# Altium footprint library 3M THD.PcbLib: 163 footprints (part 3 of 14) (continued)
## 3M_10268-6212PC [mm] "68 contacts, Mini D Ribbon (MDR), .050\" Boardmount Through-hole Vertical Receptacle - Shielded"
height 11
pads (70):
  round 1.4 hole 0.8: 1(20.955,2.858) 2(19.685,0.953) 3(18.415,2.858) 4(17.145,0.953) 5(15.875,2.858) 6(14.605,0.953) 7(13.335,2.858) 8(12.065,0.953) 9(10.795,2.858) 10(9.525,0.953) 11(8.255,2.858) 12(6.985,0.953) 13(5.715,2.858) 14(4.445,0.953) 15(3.175,2.858) 16(1.905,0.953) 17(0.635,2.858) 18(-0.635,0.953) 19(-1.905,2.858) 20(-3.175,0.953) 21(-4.445,2.858) 22(-5.715,0.953) 23(-6.985,2.858) 24(-8.255,0.953) 25(-9.525,2.858) 26(-10.795,0.953) 27(-12.065,2.858) 28(-13.335,0.953) 29(-14.605,2.858) 30(-15.875,0.953) 31(-17.145,2.858) 32(-18.415,0.953) 33(-19.685,2.858) 34(-20.955,0.953) 35(20.955,-0.952) 36(19.685,-2.857) 37(18.415,-0.952) 38(17.145,-2.857) 39(15.875,-0.952) 40(14.605,-2.857) 41(13.335,-0.952) 42(12.065,-2.857) 43(10.795,-0.952) 44(9.525,-2.857) 45(8.255,-0.952) 46(6.985,-2.857) 47(5.715,-0.952) 48(4.445,-2.857) 49(3.175,-0.952) 50(1.905,-2.857) 51(0.635,-0.952) 52(-0.635,-2.857) 53(-1.905,-0.952) 54(-3.175,-2.857) 55(-4.445,-0.952) 56(-5.715,-2.857) 57(-6.985,-0.952) 58(-8.255,-2.857) 59(-9.525,-0.952) 60(-10.795,-2.857) 61(-12.065,-0.952) 62(-13.335,-2.857) 63(-14.605,-0.952) 64(-15.875,-2.857) 65(-17.145,-0.952) 66(-18.415,-2.857) 67(-19.685,-0.952) 68(-20.955,-2.857)
  round 5.5 hole 2.8: 69(-28.956,0) 70(28.956,0)
Top Overlay:
  circle w0.3: c20.955,5.207 r0.15
  lines w0.2: -31.877,-0.684 -31.877,-4.318 -30.607,-4.318 -30.607,-4.572 30.607,-4.572 30.607,-4.318 31.877,-4.318 31.877,-0.684 ; -31.877,0.684 -31.877,4.318 -30.607,4.318 -30.607,4.572 30.607,4.572 30.607,4.318 31.877,4.318 31.877,0.684 ; -31.623,-4.318 -31.623,-1.374 ; -31.623,1.374 -31.623,4.318 ; -26.924,-2.207 -26.924,-3.556 -24.384,-3.556 -24.384,3.556 -26.924,3.556 -26.924,2.207 ; -26.41,-1.587 -25.654,-1.587 -25.654,1.588 -26.41,1.588 ; -26.289,-3.556 -26.289,-1.587 ; -26.289,1.588 -26.289,3.556 ; -23.483,1.734 cw(c-22.225,1.905) -22.551,3.132 ; -23.02,-0.035 -22.515,-1.919 ; 22.971,2.933 cw(c22.225,1.905) 23.452,1.576 23.038,0.032 ; 26.289,-3.556 26.289,-1.587 ; 26.289,1.588 26.289,3.556 ; 26.41,-1.587 25.654,-1.587 25.654,1.588 26.41,1.588 ; 26.924,-2.207 26.924,-3.556 24.384,-3.556 24.384,3.556 26.924,3.556 26.924,2.207 ; 31.623,-4.318 31.623,-1.374 ; 31.623,1.374 31.623,4.318
  text "68" at -23.67,-3.357 h1.02
  text "67" at -22.4,-1.452 h1.02
  text "33" at -22.4,2.358 h1.02
  text "34" at -23.693,0.453 h1.02
  text "36" at 20.804,-3.357 h1.02
  text "35" at 22.051,-1.452 h1.02
  text "2" at 20.622,0.453 h1.02
  text "1" at 22.106,2.358 h1.02
Mechanical 8:
  lines w0.1: -29.956,0 -28.956,0 -28.956,1 ; -21.955,-2.857 -20.955,-2.857 -20.955,-1.857 ; -21.955,0.953 -20.955,0.953 -20.955,1.953 ; -20.685,-0.952 -19.685,-0.952 -19.685,0.048 ; -20.685,2.858 -19.685,2.858 -19.685,3.858 ; -19.415,-2.857 -18.415,-2.857 -18.415,-1.857 ; -19.415,0.953 -18.415,0.953 -18.415,1.953 ; -18.145,-0.952 -17.145,-0.952 -17.145,0.048 ; -18.145,2.858 -17.145,2.858 -17.145,3.858 ; -16.875,-2.857 -15.875,-2.857 -15.875,-1.857 ; -16.875,0.953 -15.875,0.953 -15.875,1.953 ; -15.605,-0.952 -14.605,-0.952 -14.605,0.048 ; -15.605,2.858 -14.605,2.858 -14.605,3.858 ; -14.335,-2.857 -13.335,-2.857 -13.335,-1.857 ; -14.335,0.953 -13.335,0.953 -13.335,1.953 ; -13.065,-0.952 -12.065,-0.952 -12.065,0.048 ; -13.065,2.858 -12.065,2.858 -12.065,3.858 ; -11.795,-2.857 -10.795,-2.857 -10.795,-1.857 ; -11.795,0.953 -10.795,0.953 -10.795,1.953 ; -10.525,-0.952 -9.525,-0.952 -9.525,0.048 ; -10.525,2.858 -9.525,2.858 -9.525,3.858 ; -9.255,-2.857 -8.255,-2.857 -8.255,-1.857 ; -9.255,0.953 -8.255,0.953 -8.255,1.953 ; -7.985,-0.952 -6.985,-0.952 -6.985,0.048 ; -7.985,2.858 -6.985,2.858 -6.985,3.858 ; -6.715,-2.857 -5.715,-2.857 -5.715,-1.857 ; -6.715,0.953 -5.715,0.953 -5.715,1.953 ; -5.445,-0.952 -4.445,-0.952 -4.445,0.048 ; -5.445,2.858 -4.445,2.858 -4.445,3.858 ; -4.175,-2.857 -3.175,-2.857 -3.175,-1.857 ; -4.175,0.953 -3.175,0.953 -3.175,1.953 ; -2.905,-0.952 -1.905,-0.952 -1.905,0.048 ; -2.905,2.858 -1.905,2.858 -1.905,3.858 ; -1.635,-2.857 -0.635,-2.857 -0.635,-1.857 ; -1.635,0.953 -0.635,0.953 -0.635,1.953 ; -1,0 0,0 0,-1 ; -0.365,-0.952 0.635,-0.952 0.635,0.048 ; -0.365,2.858 0.635,2.858 0.635,3.858 ; 0.905,-2.857 1.905,-2.857 1.905,-1.857 ; 0.905,0.953 1.905,0.953 1.905,1.953 ; 2.175,-0.952 3.175,-0.952 3.175,0.048 ; 2.175,2.858 3.175,2.858 3.175,3.858 ; 3.445,-2.857 4.445,-2.857 4.445,-1.857 ; 3.445,0.953 4.445,0.953 4.445,1.953 ; 4.715,-0.952 5.715,-0.952 5.715,0.048 ; 4.715,2.858 5.715,2.858 5.715,3.858 ; 5.985,-2.857 6.985,-2.857 6.985,-1.857 ; 5.985,0.953 6.985,0.953 6.985,1.953 ; 7.255,-0.952 8.255,-0.952 8.255,0.048 ; 7.255,2.858 8.255,2.858 8.255,3.858 ; 8.525,-2.857 9.525,-2.857 9.525,-1.857 ; 8.525,0.953 9.525,0.953 9.525,1.953 ; 9.795,-0.952 10.795,-0.952 10.795,0.048 ; 9.795,2.858 10.795,2.858 10.795,3.858 ; 11.065,-2.857 12.065,-2.857 12.065,-1.857 ; 11.065,0.953 12.065,0.953 12.065,1.953 ; 12.335,-0.952 13.335,-0.952 13.335,0.048 ; 12.335,2.858 13.335,2.858 13.335,3.858 ; 13.605,-2.857 14.605,-2.857 14.605,-1.857 ; 13.605,0.953 14.605,0.953 14.605,1.953 ; 14.875,-0.952 15.875,-0.952 15.875,0.048 ; 14.875,2.858 15.875,2.858 15.875,3.858 ; 16.145,-2.857 17.145,-2.857 17.145,-1.857 ; 16.145,0.953 17.145,0.953 17.145,1.953 ; 17.415,-0.952 18.415,-0.952 18.415,0.048 ; 17.415,2.858 18.415,2.858 18.415,3.858 ; 18.685,-2.857 19.685,-2.857 19.685,-1.857 ; 18.685,0.953 19.685,0.953 19.685,1.953 ; 19.955,-0.952 20.955,-0.952 20.955,0.048 ; 19.955,2.858 20.955,2.858 20.955,3.858 ; 27.956,0 28.956,0 28.956,1 ; -32.956,-5 -32.956,5 -23.956,5 -23.956,-5 -32.956,-5 ; 23.956,-5 23.956,5 32.956,5 32.956,-5 23.956,-5
Mechanical 14:
  drawing of 252 lines, arcs and shapes, not listed
3D body "3M-10268-6212PC.stp": height 11.18, standoff -3.4, extent -31.877,-4.572 31.877,4.572

## 3M_12226-1150-00FR [mm] "26 contacts, 0.8mm Pitch, Through-hole Vertical Shrunk Delta Ribbon (SDR) Receptacle, 112 Series"
height 11.8
pads (30):
  round 1.15 hole 0.65: 1(4.8,2.13) 2(4,0.98) 3(3.2,2.13) 4(2.4,0.98) 5(1.6,2.13) 6(0.8,0.98) 7(0,2.13) 8(-0.8,0.98) 9(-1.6,2.13) 10(-2.4,0.98) 11(-3.2,2.13) 12(-4,0.98) 13(-4.8,2.13) 14(4.8,-0.98) 15(4,-2.13) 16(3.2,-0.98) 17(2.4,-2.13) 18(1.6,-0.98) 19(0.8,-2.13) 20(0,-0.98) 21(-0.8,-2.13) 22(-1.6,-0.98) 23(-2.4,-2.13) 24(-3.2,-0.98) 25(-4,-2.13) 26(-4.8,-0.98)
  round 1.9 hole 1.2: 27(-6.925,0) 28(6.925,0)
  round 1 hole 1.75 mask+0.375: MECH1(-6.15,-2.975) MECH2(6.15,-2.975)
Top Overlay:
  lines w0.2: -8.094,-0.675 cw(c-9.6,0) -8.094,0.675 ; -7.928,-0.903 cw(c-9.6,0) -7.928,0.903 ; -7.333,-2.5 -12.4,-2.5 -12.4,2.5 -5.756,2.5 ; -6.624,1.316 cw(c-5.8,0.75) -5.8,1.75 -5.752,1.75 ; -6.525,2.5 -6.525,3.75 -5.775,3.75 -5.775,2.5 ; -6.327,1.21 cw(c-5.8,0.75) -5.8,1.45 -5.567,1.45 ; -6.294,-1.194 ccw(c-5.398,-0.75) -5.48,-1.747 ; -6.043,-1.022 ccw(c-5.398,-0.75) -5.755,-1.352 ; 5.481,-1.747 ccw(c5.398,-0.75) 6.294,-1.194 ; 5.567,1.45 5.775,1.45 cw(c5.791,0.731) 6.327,1.21 ; 5.752,1.75 5.8,1.75 cw(c5.8,0.75) 6.624,1.316 ; 5.755,-1.352 ccw(c5.398,-0.75) 6.043,-1.022 ; 5.756,2.5 12.4,2.5 12.4,-2.5 7.333,-2.5 ; 5.775,2.5 5.775,3.75 6.525,3.75 6.525,2.5 ; 7.929,-0.903 ccw(c9.6,0) 7.929,0.903 ; 8.094,-0.675 ccw(c9.6,0) 8.094,0.675 ; 4.3,3.75 5.3,3.75 4.8,3.25 4.3,3.75
Mechanical 8:
  circle w0.1: c6.15,-2.975 r0.875
  circle w0.1: c-6.15,-2.975 r0.875
  circle w0.1: c-6.925,0 r0.6
  circle w0.1: c6.925,0 r0.6
  circle w0.1: c6.925,0 r0.95
  circle w0.1: c-6.925,0 r0.95
  circle w0.1: c4.8,2.13 r0.325
  lines w0.1: -7.425,0 -6.925,0 ; -6.925,-0.5 -6.925,0 ; -6.925,0.5 -6.925,0 ; -6.65,-2.975 -6.15,-2.975 ; -6.425,0 -6.925,0 ; -6.15,-3.475 -6.15,-2.975 ; -6.15,-2.475 -6.15,-2.975 ; -5.65,-2.975 -6.15,-2.975 ; -5.3,-0.98 -4.8,-0.98 ; -5.3,2.13 -4.8,2.13 ; -4.8,-1.48 -4.8,-0.98 ; -4.8,-0.48 -4.8,-0.98 ; -4.8,1.63 -4.8,2.13 ; -4.8,2.63 -4.8,2.13 ; -4.5,-2.13 -4,-2.13 ; -4.5,0.98 -4,0.98 ; -4.3,-0.98 -4.8,-0.98 ; -4.3,2.13 -4.8,2.13 ; -4,-2.63 -4,-2.13 ; -4,-1.63 -4,-2.13 ; -4,0.48 -4,0.98 ; -4,1.48 -4,0.98 ; -3.7,-0.98 -3.2,-0.98 ; -3.7,2.13 -3.2,2.13 ; -3.5,-2.13 -4,-2.13 ; -3.5,0.98 -4,0.98 ; -3.2,-1.48 -3.2,-0.98 ; -3.2,-0.48 -3.2,-0.98 ; -3.2,1.63 -3.2,2.13 ; -3.2,2.63 -3.2,2.13 ; -2.9,-2.13 -2.4,-2.13 ; -2.9,0.98 -2.4,0.98 ; -2.7,-0.98 -3.2,-0.98 ; -2.7,2.13 -3.2,2.13 ; -2.4,-2.63 -2.4,-2.13 ; -2.4,-1.63 -2.4,-2.13 ; -2.4,0.48 -2.4,0.98 ; -2.4,1.48 -2.4,0.98 ; -2.1,-0.98 -1.6,-0.98 ; -2.1,2.13 -1.6,2.13 ; -1.9,-2.13 -2.4,-2.13 ; -1.9,0.98 -2.4,0.98 ; -1.6,-1.48 -1.6,-0.98 ; -1.6,-0.48 -1.6,-0.98 ; -1.6,1.63 -1.6,2.13 ; -1.6,2.63 -1.6,2.13 ; -1.3,-2.13 -0.8,-2.13 ; -1.3,0.98 -0.8,0.98 ; -1.1,-0.98 -1.6,-0.98 ; -1.1,2.13 -1.6,2.13 ; -0.8,-2.63 -0.8,-2.13 ; -0.8,-1.63 -0.8,-2.13 ; -0.8,0.48 -0.8,0.98 ; -0.8,1.48 -0.8,0.98 ; -0.5,-0.98 0,-0.98 ; -0.5,2.13 0,2.13 ; -0.354,-0.354 0,0 ; -0.354,0.354 0,0 ; -0.3,-2.13 -0.8,-2.13 ; -0.3,0.98 -0.8,0.98 ; 0,-1.48 0,-0.98 ; 0,-0.48 0,-0.98 ; 0,1.63 0,2.13 ; 0,2.63 0,2.13 ; 0.3,-2.13 0.8,-2.13 ; 0.3,0.98 0.8,0.98 ; 0.354,-0.354 0,0 ; 0.354,0.354 0,0 ; 0.5,-0.98 0,-0.98 ; 0.5,2.13 0,2.13 ; 0.8,-2.63 0.8,-2.13 ; 0.8,-1.63 0.8,-2.13 ; 0.8,0.48 0.8,0.98 ; 0.8,1.48 0.8,0.98 ; 1.1,-0.98 1.6,-0.98 ; 1.1,2.13 1.6,2.13 ; 1.3,-2.13 0.8,-2.13 ; 1.3,0.98 0.8,0.98 ; 1.6,-1.48 1.6,-0.98 ; 1.6,-0.48 1.6,-0.98 ; 1.6,1.63 1.6,2.13 ; 1.6,2.63 1.6,2.13 ; 1.9,-2.13 2.4,-2.13 ; 1.9,0.98 2.4,0.98 ; 2.1,-0.98 1.6,-0.98 ; 2.1,2.13 1.6,2.13 ; 2.4,-2.63 2.4,-2.13 ; 2.4,-1.63 2.4,-2.13 ; 2.4,0.48 2.4,0.98 ; 2.4,1.48 2.4,0.98 ; 2.7,-0.98 3.2,-0.98 ; 2.7,2.13 3.2,2.13 ; 2.9,-2.13 2.4,-2.13 ; 2.9,0.98 2.4,0.98 ; 3.2,-1.48 3.2,-0.98 ; 3.2,-0.48 3.2,-0.98 ; 3.2,1.63 3.2,2.13 ; 3.2,2.63 3.2,2.13 ; 3.5,-2.13 4,-2.13 ; 3.5,0.98 4,0.98 ; 3.7,-0.98 3.2,-0.98 ; 3.7,2.13 3.2,2.13 ; 4,-2.63 4,-2.13 ; 4,-1.63 4,-2.13 ; 4,0.48 4,0.98 ; 4,1.48 4,0.98 ; 4.3,-0.98 4.8,-0.98 ; 4.3,2.13 4.8,2.13 ; 4.5,-2.13 4,-2.13 ; 4.5,0.98 4,0.98 ; 4.8,-1.48 4.8,-0.98 ; 4.8,-0.48 4.8,-0.98 ; 4.8,1.63 4.8,2.13 ; 4.8,2.63 4.8,2.13 ; 5.3,-0.98 4.8,-0.98 ; 5.3,2.13 4.8,2.13 ; 5.65,-2.975 6.15,-2.975 ; 6.15,-3.475 6.15,-2.975 ; 6.15,-2.475 6.15,-2.975 ; 6.425,0 6.925,0 ; 6.65,-2.975 6.15,-2.975 ; 6.925,-0.5 6.925,0 ; 6.925,0.5 6.925,0 ; 7.425,0 6.925,0
Mechanical 14:
  circle w0.1: c-9.6,0 r1.9
  circle w0.1: c9.6,0 r1.9
  circle w0.1: c9.6,0 r1.65
  circle w0.1: c-9.6,0 r1.65
  lines w0.1: -6.525,2.5 -6.525,3.75 -5.775,3.75 -5.775,2.5 ; -4.95,-0.6 -4.95,-0.2 -4.65,-0.2 -4.65,-0.6 ; -4.95,0.6 -4.95,0.2 -4.65,0.2 -4.65,0.6 ; -4.15,-0.6 -4.15,-0.2 -3.85,-0.2 -3.85,-0.6 ; -4.15,0.6 -4.15,0.2 -3.85,0.2 -3.85,0.6 ; -3.35,-0.6 -3.35,-0.2 -3.05,-0.2 -3.05,-0.6 ; -3.35,0.6 -3.35,0.2 -3.05,0.2 -3.05,0.6 ; -2.55,-0.6 -2.55,-0.2 -2.25,-0.2 -2.25,-0.6 ; -2.55,0.6 -2.55,0.2 -2.25,0.2 -2.25,0.6 ; -1.75,-0.6 -1.75,-0.2 -1.45,-0.2 -1.45,-0.6 ; -1.75,0.6 -1.75,0.2 -1.45,0.2 -1.45,0.6 ; -0.95,-0.6 -0.95,-0.2 -0.65,-0.2 -0.65,-0.6 ; -0.95,0.6 -0.95,0.2 -0.65,0.2 -0.65,0.6 ; -0.15,-0.6 -0.15,-0.2 0.15,-0.2 0.15,-0.6 ; -0.15,0.6 -0.15,0.2 0.15,0.2 0.15,0.6 ; 0.65,-0.6 0.65,-0.2 0.95,-0.2 0.95,-0.6 ; 0.65,0.6 0.65,0.2 0.95,0.2 0.95,0.6 ; 1.45,-0.6 1.45,-0.2 1.75,-0.2 1.75,-0.6 ; 1.45,0.6 1.45,0.2 1.75,0.2 1.75,0.6 ; 2.25,-0.6 2.25,-0.2 2.55,-0.2 2.55,-0.6 ; 2.25,0.6 2.25,0.2 2.55,0.2 2.55,0.6 ; 3.05,-0.6 3.05,-0.2 3.35,-0.2 3.35,-0.6 ; 3.05,0.6 3.05,0.2 3.35,0.2 3.35,0.6 ; 3.85,-0.6 3.85,-0.2 4.15,-0.2 4.15,-0.6 ; 3.85,0.6 3.85,0.2 4.15,0.2 4.15,0.6 ; 4.65,-0.6 4.65,-0.2 4.95,-0.2 4.95,-0.6 ; 4.65,0.6 4.65,0.2 4.95,0.2 4.95,0.6 ; 5.775,1.45 -5.8,1.45 ccw(c-5.8,0.75) -6.476,0.569 -6.074,-0.931 ccw(c-5.398,-0.75) -5.398,-1.45 5.398,-1.45 ccw(c5.398,-0.75) 6.074,-0.931 6.49,0.565 ccw(c5.791,0.731) 5.8,1.45 ; 5.775,2.5 5.775,3.75 6.525,3.75 6.525,2.5 ; -12.4,-2.5 12.4,-2.5 12.4,2.5 -12.4,2.5 -12.4,-2.5 ; -6.766,0.491 cw(c-5.8,0.75) -5.8,1.75 5.8,1.75 cw(c5.8,0.75) 6.766,0.491 6.364,-1.009 cw(c5.398,-0.75) 5.398,-1.75 -5.398,-1.75 cw(c-5.398,-0.75) -6.364,-1.009 -6.766,0.491 ; -5.6,-0.6 5.6,-0.6 5.6,0.6 -5.6,0.6 -5.6,-0.6 ; 4.3,3.75 4.8,3.25 5.3,3.75 4.3,3.75
3D body "3M_12226-1150-00FR.stp": height 11.5, standoff -2.32, extent -12.4,-3.75 12.4,3.75

## 3M_12226-5150-00FR [mm] "26 contacts, 0.8mm Pitch, Through-hole Right Angle Shrunk Delta Ribbon (SDR) Receptacle, 122 Series"
height 5.3
pads (28):
  round 1.1 hole 0.65: 1(-4.6,-1.9) 2(-3.8,-0.75) 3(-3,-1.9) 4(-2.2,-0.75) 5(-1.4,-1.9) 6(-0.6,-0.75) 7(0.2,-1.9) 8(1,-0.75) 9(1.8,-1.9) 10(2.6,-0.75) 11(3.4,-1.9) 12(4.2,-0.75) 13(5,-1.9) 14(-5,0.45) 15(-4.2,1.6) 16(-3.4,0.45) 17(-2.6,1.6) 18(-1.8,0.45) 19(-1,1.6) 20(-0.2,0.45) 21(0.6,1.6) 22(1.4,0.45) 23(2.2,1.6) 24(3,0.45) 25(3.8,1.6) 26(4.6,0.45)
  round 3 hole 2.3: 27(-9.6,0) 28(9.6,0)
Top Overlay:
  lines w0.2: -12.4,3.05 12.4,3.05 ; -11.5,6.6 -11.5,9.744 -7.7,9.744 -7.7,6.6 ; -11.1,9.744 -11.1,11.244 ; -10.449,-1.7 -12.4,-1.7 -12.4,6.6 12.4,6.6 12.4,-1.7 10.449,-1.7 ; -8.751,-1.7 -8.4,-1.7 -8.4,-2.95 8.4,-2.95 8.4,-1.7 8.751,-1.7 ; -8.1,9.744 -8.1,11.244 ; -6.766,6.6 -6.766,12.3 cw(c-6.466,12.3) -6.466,12.6 6.466,12.6 cw(c6.466,12.3) 6.766,12.3 6.766,6.6 ; -5.8,-2.95 -5.8,-0.107 ; -5.8,1.007 -5.8,3.05 ; 5.8,-2.95 5.8,-2.457 ; 5.8,-1.343 5.8,3.05 ; 7.7,6.6 7.7,9.744 11.5,9.744 11.5,6.6 ; 8.1,9.744 8.1,11.244 ; 11.1,9.744 11.1,11.244 ; -11.5,11.47 -7.7,11.47 ; -11.5,11.47 -11.5,11.244 -7.7,11.244 -7.7,11.47 ; -11.5,11.47 -11.25,12.4 -7.95,12.4 -7.7,11.47 ; 7.7,11.47 11.5,11.47 ; 7.7,11.47 7.95,12.4 11.25,12.4 11.5,11.47 ; 7.7,11.47 7.7,11.244 11.5,11.244 11.5,11.47 ; -5.1,-3.52 -4.1,-3.52 -4.6,-3.02 -5.1,-3.52
Mechanical 8:
  circle w0.1: c-4.2,1.6 r0.328
  circle w0.1: c-4.2,1.6 r0.575
  circle w0.1: c9.6,0 r1.5
  circle w0.1: c9.6,0 r1.15
  circle w0.1: c-9.6,0 r1.5
  circle w0.1: c-9.6,0 r1.15
  lines w0.1: -12.4,6.1 0,6.1 12.4,6.1 ; -10.1,0 -9.6,0 ; -9.6,-0.5 -9.6,0 ; -9.6,0.5 -9.6,0 ; -9.1,0 -9.6,0 ; -5.5,0.45 -5,0.45 ; -5.1,-1.9 -4.6,-1.9 ; -5,-0.05 -5,0.45 ; -5,0.95 -5,0.45 ; -4.7,1.6 -4.2,1.6 ; -4.6,-2.4 -4.6,-1.9 ; -4.6,-1.4 -4.6,-1.9 ; -4.5,0.45 -5,0.45 ; -4.3,-0.75 -3.8,-0.75 ; -4.2,1.1 -4.2,1.6 ; -4.2,2.1 -4.2,1.6 ; -4.1,-1.9 -4.6,-1.9 ; -3.9,0.45 -3.4,0.45 ; -3.8,-1.25 -3.8,-0.75 ; -3.8,-0.25 -3.8,-0.75 ; -3.7,1.6 -4.2,1.6 ; -3.5,-1.9 -3,-1.9 ; -3.4,-0.05 -3.4,0.45 ; -3.4,0.95 -3.4,0.45 ; -3.3,-0.75 -3.8,-0.75 ; -3.1,1.6 -2.6,1.6 ; -3,-2.4 -3,-1.9 ; -3,-1.4 -3,-1.9 ; -2.9,0.45 -3.4,0.45 ; -2.7,-0.75 -2.2,-0.75 ; -2.6,1.1 -2.6,1.6 ; -2.6,2.1 -2.6,1.6 ; -2.5,-1.9 -3,-1.9 ; -2.3,0.45 -1.8,0.45 ; -2.2,-1.25 -2.2,-0.75 ; -2.2,-0.25 -2.2,-0.75 ; -2.1,1.6 -2.6,1.6 ; -1.9,-1.9 -1.4,-1.9 ; -1.8,-0.05 -1.8,0.45 ; -1.8,0.95 -1.8,0.45 ; -1.7,-0.75 -2.2,-0.75 ; -1.5,1.6 -1,1.6 ; -1.4,-2.4 -1.4,-1.9 ; -1.4,-1.4 -1.4,-1.9 ; -1.3,0.45 -1.8,0.45 ; -1.1,-0.75 -0.6,-0.75 ; -1,1.1 -1,1.6 ; -1,2.1 -1,1.6 ; -0.9,-1.9 -1.4,-1.9 ; -0.7,0.45 -0.2,0.45 ; -0.6,-1.25 -0.6,-0.75 ; -0.6,-0.25 -0.6,-0.75 ; -0.5,1.6 -1,1.6 ; -0.354,-0.354 0,0 ; -0.354,0.354 0,0 ; -0.3,-1.9 0.2,-1.9 ; -0.2,0.95 -0.2,0.45 ; -0.1,-0.75 -0.6,-0.75 ; 0.1,1.6 0.6,1.6 ; 0.2,-2.4 0.2,-1.9 ; 0.2,-1.4 0.2,-1.9 ; 0.3,0.45 -0.2,0.45 ; 0.354,-0.354 0,0 ; 0.354,0.354 0,0 ; 0.5,-0.75 1,-0.75 ; 0.6,1.1 0.6,1.6 ; 0.6,2.1 0.6,1.6 ; 0.7,-1.9 0.2,-1.9 ; 0.9,0.45 1.4,0.45 ; 1,-1.25 1,-0.75 ; 1,-0.25 1,-0.75 ; 1.1,1.6 0.6,1.6 ; 1.3,-1.9 1.8,-1.9 ; 1.4,-0.05 1.4,0.45 ; 1.4,0.95 1.4,0.45 ; 1.5,-0.75 1,-0.75 ; 1.7,1.6 2.2,1.6 ; 1.8,-2.4 1.8,-1.9 ; 1.8,-1.4 1.8,-1.9 ; 1.9,0.45 1.4,0.45 ; 2.1,-0.75 2.6,-0.75 ; 2.2,1.1 2.2,1.6 ; 2.2,2.1 2.2,1.6 ; 2.3,-1.9 1.8,-1.9 ; 2.5,0.45 3,0.45 ; 2.6,-1.25 2.6,-0.75 ; 2.6,-0.25 2.6,-0.75 ; 2.7,1.6 2.2,1.6 ; 2.9,-1.9 3.4,-1.9 ; 3,-0.05 3,0.45 ; 3,0.95 3,0.45 ; 3.1,-0.75 2.6,-0.75 ; 3.3,1.6 3.8,1.6 ; 3.4,-2.4 3.4,-1.9 ; 3.4,-1.4 3.4,-1.9 ; 3.5,0.45 3,0.45 ; 3.7,-0.75 4.2,-0.75 ; 3.8,1.1 3.8,1.6 ; 3.8,2.1 3.8,1.6 ; 3.9,-1.9 3.4,-1.9 ; 4.1,0.45 4.6,0.45 ; 4.2,-1.25 4.2,-0.75 ; 4.2,-0.25 4.2,-0.75 ; 4.3,1.6 3.8,1.6 ; 4.5,-1.9 5,-1.9 ; 4.6,-0.05 4.6,0.45 ; 4.6,0.95 4.6,0.45 ; 4.7,-0.75 4.2,-0.75 ; 5,-2.4 5,-1.9 ; 5,-1.4 5,-1.9 ; 5.1,0.45 4.6,0.45 ; 5.5,-1.9 5,-1.9 ; 9.1,0 9.6,0 ; 9.6,-0.5 9.6,0 ; 9.6,0.5 9.6,0 ; 10.1,0 9.6,0
Mechanical 14:
  lines w0.1: -12.4,3.05 12.4,3.05 ; -11.5,6.6 -11.5,9.744 -7.7,9.744 -7.7,6.6 ; -11.1,9.744 -11.1,11.244 ; -8.1,9.744 -8.1,11.244 ; -6.766,6.6 -6.766,12.3 cw(c-6.466,12.3) -6.466,12.6 6.466,12.6 cw(c6.466,12.3) 6.766,12.3 6.766,6.6 ; -5.8,-2.95 -5.8,3.05 ; 5.8,-2.95 5.8,3.05 ; 7.7,6.6 7.7,9.744 11.5,9.744 11.5,6.6 ; 8.1,9.744 8.1,11.244 ; 11.1,9.744 11.1,11.244 ; -11.5,11.47 -7.7,11.47 ; -11.5,11.47 -11.5,11.244 -7.7,11.244 -7.7,11.47 ; -11.5,11.47 -11.25,12.4 -7.95,12.4 -7.7,11.47 ; 7.7,11.47 11.5,11.47 ; 7.7,11.47 7.95,12.4 11.25,12.4 11.5,11.47 ; 7.7,11.47 7.7,11.244 11.5,11.244 11.5,11.47 ; -12.4,-1.7 -12.4,6.6 12.4,6.6 12.4,-1.7 8.4,-1.7 8.4,-2.95 -8.4,-2.95 -8.4,-1.7 -12.4,-1.7 ; -5.1,-3.52 -4.6,-3.02 -4.1,-3.52 -5.1,-3.52
3D body "3M_12226-5150-00FR.stp": height 5, standoff -2.32, extent -12.4,-2.95 12.4,12.6

## 3M_929974-01-06-RK [mm] "6 Contacts, Straight .100\" x .100\" Boardmount Socket, 929 Series"
height 8.26
pads (6):
  rect 1.7x1.7 hole 1: 1(0,0)
  round 1.7 hole 1: 2(2.54,0) 3(5.08,0) 4(7.62,0) 5(10.16,0) 6(12.7,0)
Top Overlay:
  circle w0.3: c0,-1.95 r0.15
  lines w0.2: -1.27,-1.27 -1.27,1.27 13.97,1.27 13.97,-1.27 -1.27,-1.27
Mechanical 8:
  lines w0.05: -0.5,0 0,0 ; 0,-0.5 0,0 ; 0,0.5 0,0 ; 0.5,0 0,0 ; 2.04,0 2.54,0 ; 2.54,-0.5 2.54,0 ; 2.54,0.5 2.54,0 ; 3.04,0 2.54,0 ; 4.58,0 5.08,0 ; 5.08,-0.5 5.08,0 ; 5.08,0.5 5.08,0 ; 5.58,0 5.08,0 ; 7.12,0 7.62,0 ; 7.62,-0.5 7.62,0 ; 7.62,0.5 7.62,0 ; 8.12,0 7.62,0 ; 9.66,0 10.16,0 ; 10.16,-0.5 10.16,0 ; 10.16,0.5 10.16,0 ; 10.66,0 10.16,0 ; 12.2,0 12.7,0 ; 12.7,-0.5 12.7,0 ; 12.7,0.5 12.7,0 ; 13.2,0 12.7,0
Mechanical 14:
  circle w0.3: c0,-1.95 r0.15
  lines w0.1: -0.622,-0.622 -0.368,-0.368 ; -0.622,-0.622 -0.622,0.622 ; -0.622,-0.622 0.622,-0.622 ; -0.622,0.622 -0.368,0.368 ; -0.622,0.622 0.622,0.622 ; -0.368,-0.368 0.368,-0.368 ; -0.368,-0.368 -0.368,0.368 ; -0.368,0.368 0.368,0.368 ; 0.368,-0.368 0.622,-0.622 ; 0.368,-0.368 0.368,0.368 ; 0.368,0.368 0.622,0.622 ; 0.622,-0.622 0.622,0.622 ; 1.918,-0.622 2.172,-0.368 ; 1.918,-0.622 1.918,0.622 ; 1.918,-0.622 3.162,-0.622 ; 1.918,0.622 2.172,0.368 ; 1.918,0.622 3.162,0.622 ; 2.172,-0.368 2.908,-0.368 ; 2.172,-0.368 2.172,0.368 ; 2.172,0.368 2.908,0.368 ; 2.908,-0.368 3.162,-0.622 ; 2.908,-0.368 2.908,0.368 ; 2.908,0.368 3.162,0.622 ; 3.162,-0.622 3.162,0.622 ; 4.458,-0.622 4.712,-0.368 ; 4.458,-0.622 4.458,0.622 ; 4.458,-0.622 5.702,-0.622 ; 4.458,0.622 4.712,0.368 ; 4.458,0.622 5.702,0.622 ; 4.712,-0.368 5.448,-0.368 ; 4.712,-0.368 4.712,0.368 ; 4.712,0.368 5.448,0.368 ; 5.448,-0.368 5.702,-0.622 ; 5.448,-0.368 5.448,0.368 ; 5.448,0.368 5.702,0.622 ; 5.702,-0.622 5.702,0.622 ; 6.998,-0.622 7.252,-0.368 ; 6.998,-0.622 6.998,0.622 ; 6.998,-0.622 8.242,-0.622 ; 6.998,0.622 7.252,0.368 ; 6.998,0.622 8.242,0.622 ; 7.252,-0.368 7.988,-0.368 ; 7.252,-0.368 7.252,0.368 ; 7.252,0.368 7.988,0.368 ; 7.988,-0.368 8.242,-0.622 ; 7.988,-0.368 7.988,0.368 ; 7.988,0.368 8.242,0.622 ; 8.242,-0.622 8.242,0.622 ; 9.538,-0.622 9.792,-0.368 ; 9.538,-0.622 9.538,0.622 ; 9.538,-0.622 10.782,-0.622 ; 9.538,0.622 9.792,0.368 ; 9.538,0.622 10.782,0.622 ; 9.792,-0.368 10.528,-0.368 ; 9.792,-0.368 9.792,0.368 ; 9.792,0.368 10.528,0.368 ; 10.528,-0.368 10.782,-0.622 ; 10.528,-0.368 10.528,0.368 ; 10.528,0.368 10.782,0.622 ; 10.782,-0.622 10.782,0.622 ; 12.078,-0.622 12.332,-0.368 ; 12.078,-0.622 12.078,0.622 ; 12.078,-0.622 13.322,-0.622 ; 12.078,0.622 12.332,0.368 ; 12.078,0.622 13.322,0.622 ; 12.332,-0.368 13.068,-0.368 ; 12.332,-0.368 12.332,0.368 ; 12.332,0.368 13.068,0.368 ; 13.068,-0.368 13.322,-0.622 ; 13.068,-0.368 13.068,0.368 ; 13.068,0.368 13.322,0.622 ; 13.322,-0.622 13.322,0.622 ; -1.27,-1.27 -1.27,1.27 13.97,1.27 13.97,-1.27 -1.27,-1.27
3D body "3M_929974-01-06-RK.stp": height 8.25, standoff -3.17, extent -1.27,-1.27 13.97,1.27

## 3M_950420-6102-AR [mm] "20 Contacts - mm x 2 mm Straight, Boardmount Socket"
height 4.3
pads (20):
  round 1.5 hole 0.8: 1(-9,1) 2(-9,-1) 3(-7,1) 4(-7,-1) 5(-5,1) 6(-5,-1) 7(-3,1) 8(-3,-1) 9(-1,1) 10(-1,-1) 11(1,1) 12(1,-1) 13(3,1) 14(3,-1) 15(5,1) 16(5,-1) 17(7,1) 18(7,-1) 19(9,1) 20(9,-1)
Top Overlay:
  circle w0.3: c-8.925,2.925 r0.15
  lines w0.2: -10.25,-2.3 -10.25,2.3 10.25,2.3 10.25,-2.3 -10.25,-2.3
  text "20" at 10.71,-1.565 h1.2
  text "1" at -10.988,0.55 h1.2
Mechanical 8:
  lines w0.1: -9.5,-1 -9,-1 ; -9.5,1 -9,1 ; -9,-1.5 -9,-1 ; -9,-0.5 -9,-1 ; -9,0.5 -9,1 ; -9,1.5 -9,1 ; -8.5,-1 -9,-1 ; -8.5,1 -9,1 ; -7.5,-1 -7,-1 ; -7.5,1 -7,1 ; -7,-1.5 -7,-1 ; -7,-0.5 -7,-1 ; -7,0.5 -7,1 ; -7,1.5 -7,1 ; -6.5,-1 -7,-1 ; -6.5,1 -7,1 ; -5.5,-1 -5,-1 ; -5.5,1 -5,1 ; -5,-1.5 -5,-1 ; -5,-0.5 -5,-1 ; -5,0.5 -5,1 ; -5,1.5 -5,1 ; -4.5,-1 -5,-1 ; -4.5,1 -5,1 ; -3.5,-1 -3,-1 ; -3.5,1 -3,1 ; -3,-1.5 -3,-1 ; -3,-0.5 -3,-1 ; -3,0.5 -3,1 ; -3,1.5 -3,1 ; -2.5,-1 -3,-1 ; -2.5,1 -3,1 ; -1.5,-1 -1,-1 ; -1.5,1 -1,1 ; -1,-1.5 -1,-1 ; -1,-0.5 -1,-1 ; -1,0.5 -1,1 ; -1,1.5 -1,1 ; -0.5,-1 -1,-1 ; -0.5,0 0,0 ; -0.5,1 -1,1 ; 0,-0.5 0,0 ; 0,0.5 0,0 ; 0.5,-1 1,-1 ; 0.5,0 0,0 ; 0.5,1 1,1 ; 1,-1.5 1,-1 ; 1,-0.5 1,-1 ; 1,0.5 1,1 ; 1,1.5 1,1 ; 1.5,-1 1,-1 ; 1.5,1 1,1 ; 2.5,-1 3,-1 ; 2.5,1 3,1 ; 3,-1.5 3,-1 ; 3,-0.5 3,-1 ; 3,0.5 3,1 ; 3,1.5 3,1 ; 3.5,-1 3,-1 ; 3.5,1 3,1 ; 4.5,-1 5,-1 ; 4.5,1 5,1 ; 5,-1.5 5,-1 ; 5,-0.5 5,-1 ; 5,0.5 5,1 ; 5,1.5 5,1 ; 5.5,-1 5,-1 ; 5.5,1 5,1 ; 6.5,-1 7,-1 ; 6.5,1 7,1 ; 7,-1.5 7,-1 ; 7,-0.5 7,-1 ; 7,0.5 7,1 ; 7,1.5 7,1 ; 7.5,-1 7,-1 ; 7.5,1 7,1 ; 8.5,-1 9,-1 ; 8.5,1 9,1 ; 9,-1.5 9,-1 ; 9,-0.5 9,-1 ; 9,0.5 9,1 ; 9,1.5 9,1 ; 9.5,-1 9,-1 ; 9.5,1 9,1
Mechanical 14:
  drawing of 245 lines, arcs and shapes, not listed
  text "20" at 10.71,-1.565 h1.2
  text "1" at -10.988,0.55 h1.2
3D body "3M_950420-6102-AR.stp": height 4.3, standoff -2.7, extent -10.25,-2.3 10.25,2.3

## 3M_950432-6102-AR [mm] "32 Contacts - mm x 2 mm Straight, Boardmount Socket"
height 4.3
pads (32):
  round 1.5 hole 0.8: 1(-15,1) 2(-15,-1) 3(-13,1) 4(-13,-1) 5(-11,1) 6(-11,-1) 7(-9,1) 8(-9,-1) 9(-7,1) 10(-7,-1) 11(-5,1) 12(-5,-1) 13(-3,1) 14(-3,-1) 15(-1,1) 16(-1,-1) 17(1,1) 18(1,-1) 19(3,1) 20(3,-1) 21(5,1) 22(5,-1) 23(7,1) 24(7,-1) 25(9,1) 26(9,-1) 27(11,1) 28(11,-1) 29(13,1) 30(13,-1) 31(15,1) 32(15,-1)
Top Overlay:
  circle w0.3: c-14.925,2.925 r0.15
  lines w0.2: -16.25,-2.3 -16.25,2.3 16.25,2.3 16.25,-2.3 -16.25,-2.3
  text "32" at 16.685,-1.515 h1.2
  text "1" at -16.988,0.55 h1.2
Mechanical 8:
  lines w0.1: -15.5,-1 -15,-1 ; -15.5,1 -15,1 ; -15,-1.5 -15,-1 ; -15,-0.5 -15,-1 ; -15,0.5 -15,1 ; -15,1.5 -15,1 ; -14.5,-1 -15,-1 ; -14.5,1 -15,1 ; -13.5,-1 -13,-1 ; -13.5,1 -13,1 ; -13,-1.5 -13,-1 ; -13,-0.5 -13,-1 ; -13,0.5 -13,1 ; -13,1.5 -13,1 ; -12.5,-1 -13,-1 ; -12.5,1 -13,1 ; -11.5,-1 -11,-1 ; -11.5,1 -11,1 ; -11,-1.5 -11,-1 ; -11,-0.5 -11,-1 ; -11,0.5 -11,1 ; -11,1.5 -11,1 ; -10.5,-1 -11,-1 ; -10.5,1 -11,1 ; -9.5,-1 -9,-1 ; -9.5,1 -9,1 ; -9,-1.5 -9,-1 ; -9,-0.5 -9,-1 ; -9,0.5 -9,1 ; -9,1.5 -9,1 ; -8.5,-1 -9,-1 ; -8.5,1 -9,1 ; -7.5,-1 -7,-1 ; -7.5,1 -7,1 ; -7,-1.5 -7,-1 ; -7,-0.5 -7,-1 ; -7,0.5 -7,1 ; -7,1.5 -7,1 ; -6.5,-1 -7,-1 ; -6.5,1 -7,1 ; -5.5,-1 -5,-1 ; -5.5,1 -5,1 ; -5,-1.5 -5,-1 ; -5,-0.5 -5,-1 ; -5,0.5 -5,1 ; -5,1.5 -5,1 ; -4.5,-1 -5,-1 ; -4.5,1 -5,1 ; -3.5,-1 -3,-1 ; -3.5,1 -3,1 ; -3,-1.5 -3,-1 ; -3,-0.5 -3,-1 ; -3,0.5 -3,1 ; -3,1.5 -3,1 ; -2.5,-1 -3,-1 ; -2.5,1 -3,1 ; -1.5,-1 -1,-1 ; -1.5,1 -1,1 ; -1,-1.5 -1,-1 ; -1,-0.5 -1,-1 ; -1,0.5 -1,1 ; -1,1.5 -1,1 ; -0.5,-1 -1,-1 ; -0.5,0 0,0 ; -0.5,1 -1,1 ; 0,-0.5 0,0 ; 0,0.5 0,0 ; 0.5,-1 1,-1 ; 0.5,0 0,0 ; 0.5,1 1,1 ; 1,-1.5 1,-1 ; 1,-0.5 1,-1 ; 1,0.5 1,1 ; 1,1.5 1,1 ; 1.5,-1 1,-1 ; 1.5,1 1,1 ; 2.5,-1 3,-1 ; 2.5,1 3,1 ; 3,-1.5 3,-1 ; 3,-0.5 3,-1 ; 3,0.5 3,1 ; 3,1.5 3,1 ; 3.5,-1 3,-1 ; 3.5,1 3,1 ; 4.5,-1 5,-1 ; 4.5,1 5,1 ; 5,-1.5 5,-1 ; 5,-0.5 5,-1 ; 5,0.5 5,1 ; 5,1.5 5,1 ; 5.5,-1 5,-1 ; 5.5,1 5,1 ; 6.5,-1 7,-1 ; 6.5,1 7,1 ; 7,-1.5 7,-1 ; 7,-0.5 7,-1 ; 7,0.5 7,1 ; 7,1.5 7,1 ; 7.5,-1 7,-1 ; 7.5,1 7,1 ; 8.5,-1 9,-1 ; 8.5,1 9,1 ; 9,-1.5 9,-1 ; 9,-0.5 9,-1 ; 9,0.5 9,1 ; 9,1.5 9,1 ; 9.5,-1 9,-1 ; 9.5,1 9,1 ; 10.5,-1 11,-1 ; 10.5,1 11,1 ; 11,-1.5 11,-1 ; 11,-0.5 11,-1 ; 11,0.5 11,1 ; 11,1.5 11,1 ; 11.5,-1 11,-1 ; 11.5,1 11,1 ; 12.5,-1 13,-1 ; 12.5,1 13,1 ; 13,-1.5 13,-1 ; 13,-0.5 13,-1 ; 13,0.5 13,1 ; 13,1.5 13,1 ; 13.5,-1 13,-1 ; 13.5,1 13,1 ; 14.5,-1 15,-1 ; 14.5,1 15,1 ; 15,-1.5 15,-1 ; 15,-0.5 15,-1 ; 15,0.5 15,1 ; 15,1.5 15,1 ; 15.5,-1 15,-1 ; 15.5,1 15,1
Mechanical 14:
  drawing of 389 lines, arcs and shapes, not listed
  text "32" at 16.685,-1.515 h1.2
  text "1" at -16.988,0.55 h1.2
3D body "3M_950432-6102-AR.stp": height 4.3, standoff -2.7, extent -16.25,-2.3 16.25,2.3

## 3M_961106-6404-AR [mm] "6 Contacts, Straight .100\" x .100\" Pin Strip Header, 961 Series"
height 8
pads (6):
  rect 1.7x1.7 hole 1: 1(0,0)
  round 1.7 hole 1: 2(2.54,0) 3(5.08,0) 4(7.62,0) 5(10.16,0) 6(12.7,0)
Top Overlay:
  circle w0.3: c0,-1.95 r0.15
  lines w0.2: -1.265,-0.95 -1.265,0.95 -1.26,0.95 -0.96,1.25 0.97,1.25 1.27,0.95 1.28,0.95 1.58,1.25 3.51,1.25 3.81,0.95 3.82,0.95 4.12,1.25 6.05,1.25 6.35,0.95 6.36,0.95 6.66,1.25 8.59,1.25 8.89,0.95 8.9,0.95 9.2,1.25 11.13,1.25 11.43,0.95 11.44,0.95 11.74,1.25 13.67,1.25 13.97,0.95 13.98,0.95 13.98,-0.95 13.97,-0.95 13.67,-1.25 11.74,-1.25 11.44,-0.95 11.43,-0.95 11.13,-1.25 9.2,-1.25 8.9,-0.95 8.89,-0.95 8.59,-1.25 6.66,-1.25 6.36,-0.95 6.35,-0.95 6.05,-1.25 4.12,-1.25 3.82,-0.95 3.81,-0.95 3.51,-1.25 1.58,-1.25 1.28,-0.95 1.27,-0.95 0.97,-1.25 -0.96,-1.25 -1.26,-0.95 -1.265,-0.95
Mechanical 8:
  lines w0.05: -0.5,0 0,0 ; 0,-0.5 0,0 ; 0,0.5 0,0 ; 0.5,0 0,0 ; 2.04,0 2.54,0 ; 2.54,-0.5 2.54,0 ; 2.54,0.5 2.54,0 ; 3.04,0 2.54,0 ; 4.58,0 5.08,0 ; 5.08,-0.5 5.08,0 ; 5.08,0.5 5.08,0 ; 5.58,0 5.08,0 ; 5.85,0 6.35,0 ; 6.35,-0.5 6.35,0 ; 6.35,0.5 6.35,0 ; 6.85,0 6.35,0 ; 7.12,0 7.62,0 ; 7.62,-0.5 7.62,0 ; 7.62,0.5 7.62,0 ; 8.12,0 7.62,0 ; 9.66,0 10.16,0 ; 10.16,-0.5 10.16,0 ; 10.16,0.5 10.16,0 ; 10.66,0 10.16,0 ; 12.2,0 12.7,0 ; 12.7,-0.5 12.7,0 ; 12.7,0.5 12.7,0 ; 13.2,0 12.7,0
Mechanical 14:
  circle w0.3: c0,-1.95 r0.15
  lines w0.1: -1.265,-0.95 -1.265,0.95 -1.26,0.95 -0.96,1.25 0.97,1.25 1.27,0.95 1.28,0.95 1.58,1.25 3.51,1.25 3.81,0.95 3.82,0.95 4.12,1.25 6.05,1.25 6.35,0.95 6.36,0.95 6.66,1.25 8.59,1.25 8.89,0.95 8.9,0.95 9.2,1.25 11.13,1.25 11.43,0.95 11.44,0.95 11.74,1.25 13.67,1.25 13.97,0.95 13.98,0.95 13.98,-0.95 13.97,-0.95 13.67,-1.25 11.74,-1.25 11.44,-0.95 11.43,-0.95 11.13,-1.25 9.2,-1.25 8.9,-0.95 8.89,-0.95 8.59,-1.25 6.66,-1.25 6.36,-0.95 6.35,-0.95 6.05,-1.25 4.12,-1.25 3.82,-0.95 3.81,-0.95 3.51,-1.25 1.58,-1.25 1.28,-0.95 1.27,-0.95 0.97,-1.25 -0.96,-1.25 -1.26,-0.95 -1.265,-0.95 ; -0.312,-0.318 0.323,-0.318 0.323,0.318 -0.312,0.318 -0.312,-0.318 ; 2.228,-0.318 2.228,0.318 2.863,0.318 2.863,-0.318 2.228,-0.318 ; 4.768,-0.318 4.768,0.318 5.403,0.318 5.403,-0.318 4.768,-0.318 ; 7.308,-0.318 7.308,0.318 7.943,0.318 7.943,-0.318 7.308,-0.318 ; 9.848,-0.318 9.848,0.318 10.483,0.318 10.483,-0.318 9.848,-0.318 ; 12.388,-0.318 12.388,0.318 13.023,0.318 13.023,-0.318 12.388,-0.318
3D body "3M_961106-6404-AR.stp": height 9.3, standoff -3.3, extent -1.27,-1.25 13.975,1.25